# Altium footprint library rescap.PcbLib: 83 footprints (part 3 of 6)
Each footprint in its own frame and in the unit in brackets; x right, y up, seen from the top. Pads: shape width x height; smd on the part's side, far side on the other; paste and mask are expansions set on the pad; w line width, h text height; cw(c..) or ccw(c..) is an arc to the next point about the centre after c.
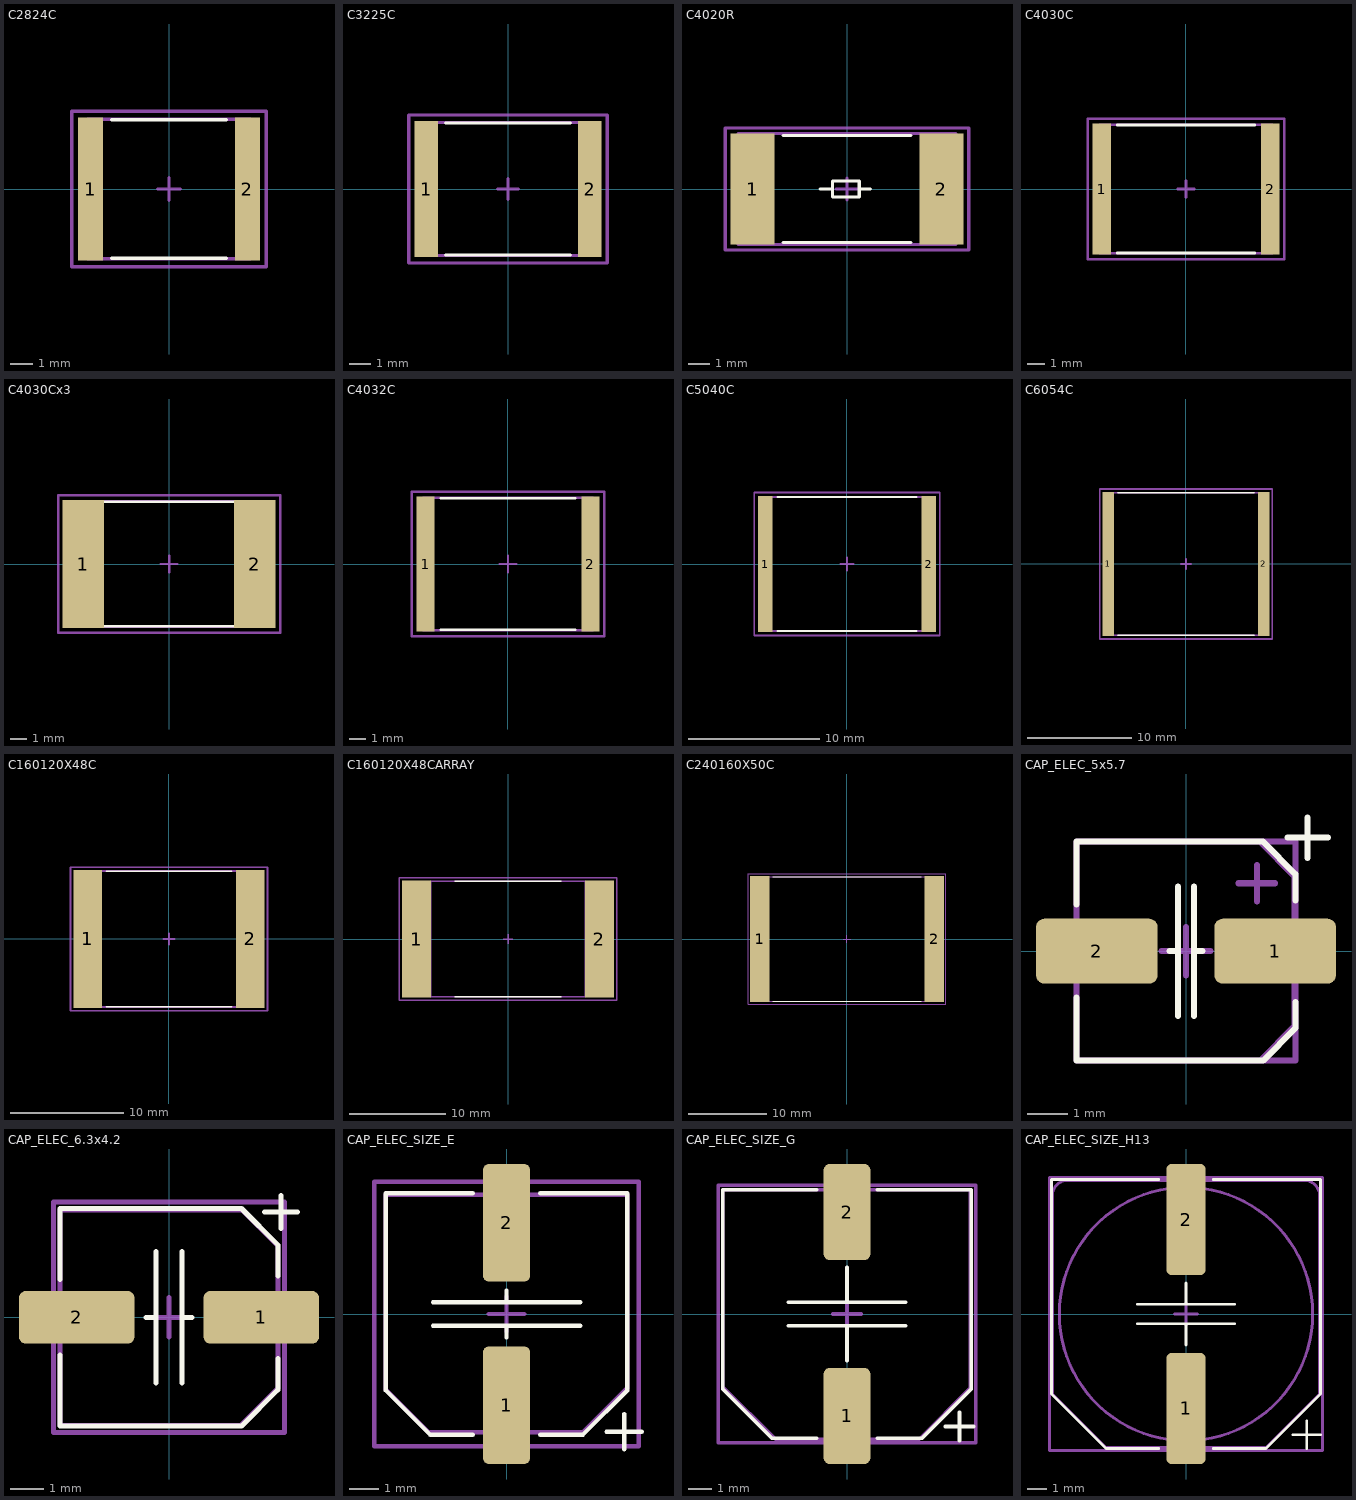
[diagram p2: the footprints below, top view; thin cyan lines are the x and y axes]

## C2824C [mm] "Chip Capacitor, 2-Leads, Body 7,10x6,10mm, IPC Medium Density"
height 3.9
pads (2):
  rect 1.1x6.25 smd: 1(-3.425,0) 2(3.425,0)
Top Overlay:
  lines w0.15: -2.5,-3.025 2.5,-3.025 ; -2.5,3.025 2.5,3.025
Mechanical 15:
  lines w0.15: -0.5,0 0.5,0 ; 0,-0.5 0,0.5 ; -4.25,-3.4 -4.25,3.4 4.25,3.4 4.25,-3.4 -4.25,-3.4
Mechanical 29:
  lines w0.15: -3.55,-3.05 -3.55,3.05 3.55,3.05 3.55,-3.05 -3.55,-3.05
  text ".Designator" at -3.1,-0.3 h1
3D body "C2824C.step": height 3.9, standoff 0, extent -3.55,-3.05 3.55,3.05

## C3225C [mm] "Chip Capacitor, 2-Leads, Body 8,00x6,30mm, IPC Medium Density"
height 3.2
pads (2):
  rect 1.1x6.45 smd: 1(-3.875,0) 2(3.875,0)
Top Overlay:
  lines w0.15: -2.95,-3.125 2.95,-3.125 ; -2.95,3.125 2.95,3.125
Mechanical 15:
  lines w0.15: -0.5,0 0.5,0 ; 0,-0.5 0,0.5 ; -4.7,-3.5 -4.7,3.5 4.7,3.5 4.7,-3.5 -4.7,-3.5
Mechanical 29:
  lines w0.15: -4,-3.15 -4,3.15 4,3.15 4,-3.15 -4,-3.15
  text ".Designator" at -3.6,-0.3 h1
3D body "C3225C.step": height 3.2, standoff 0, extent -4,-3.15 4,3.15

## C4020R [mm]
height 0.7
pads (2):
  rect 2.05x5.2 smd: 1(-4.425,0) 2(4.425,0)
Top Overlay:
  lines w0.15: -3,-2.5 3,-2.5 ; -3,2.5 3,2.5 ; -1.25,0 -0.675,0 ; 1.1,0 0.575,0 ; -0.675,0 -0.675,0.375 0.575,0.375 0.575,0 ; -0.675,0 -0.675,-0.375 0.575,-0.375 0.575,0
Mechanical 15:
  lines w0.15: -0.5,0 0.5,0 ; 0,-0.5 0,0.5 ; -5.7,-2.85 5.7,-2.85 5.7,2.85 -5.7,2.85 -5.7,-2.85
Mechanical 29:
  lines w0.15: -5.1,-2.6 5.1,-2.6 5.1,2.6 -5.1,2.6 -5.1,-2.6
  text ".Designator" at -3.8,-0.2 h1
3D body "C4020R.step": height 0.7, standoff 0, extent -5.1,-2.6 5.1,2.6

## C4030C [mm] "Chip Capacitor, 2-Leads, Body 10,20x7,60mm, IPC Medium Density"
height 3.9
pads (2):
  rect 1.1x7.75 smd: 1(-4.975,0) 2(4.975,0)
Top Overlay:
  lines w0.15: -4.05,-3.775 4.05,-3.775 ; -4.05,3.775 4.05,3.775
Mechanical 15:
  lines w0.15: -0.5,0 0.5,0 ; 0,-0.5 0,0.5 ; -5.8,-4.15 5.8,-4.15 5.8,4.15 -5.8,4.15 -5.8,-4.15
Mechanical 29:
  lines w0.15: -5.1,-3.8 5.1,-3.8 5.1,3.8 -5.1,3.8 -5.1,-3.8
  text ".Designator" at -3.4,-0.2 h1
3D body "SMD4030.STEP": height 3, standoff 0, extent -4.9,-4.2 5.1,4

## C4030Cx3 [mm] "Chip Capacitor, 2-Leads, Body 10,20x7,60mm, IPC Medium Density"
height 3.9
pads (2):
  rect 2.5x7.75 smd: 1(-5.2,0) 2(5.175,0)
Top Overlay:
  lines w0.15: -4.05,-3.775 4.05,-3.775 ; -4.05,3.775 4.05,3.775
Mechanical 15:
  lines w0.15: -0.5,0 0.5,0 ; 0,-0.5 0,0.5 ; -6.7,-4.15 6.7,-4.15 6.7,4.15 -6.7,4.15 -6.7,-4.15
Mechanical 29:
  lines w0.15: -5.1,-3.8 5.1,-3.8 5.1,3.8 -5.1,3.8 -5.1,-3.8
  text ".Designator" at -3.5,-0.3 h1
3D body: height 8, standoff 0, extent -0.501,-0.501 0.501,0.501
3D body "SMD4030.STEP": height 3, standoff 0, extent -4.9,-4.2 5.1,4
3D body "SMD4030.STEP": height 5.7, standoff 2.7, extent -4.9,-4.2 5.1,4
3D body "SMD4030.STEP": height 8.5, standoff 5.5, extent -4.9,-4.2 5.1,4

## C4032C [mm] "Chip Capacitor, 2-Leads, Body 10,20x8,00mm, IPC Medium Density"
height 3.2
pads (2):
  rect 1.1x8.15 smd: 1(-4.975,0) 2(4.975,0)
Top Overlay:
  lines w0.15: -4.05,-3.975 4.05,-3.975 ; -4.05,3.975 4.05,3.975
Mechanical 15:
  lines w0.15: -0.5,0 0.5,0 ; 0,-0.5 0,0.5 ; -5.8,-4.35 5.8,-4.35 5.8,4.35 -5.8,4.35 -5.8,-4.35
Mechanical 29:
  lines w0.15: -5.1,-4 5.1,-4 5.1,4 -5.1,4 -5.1,-4
  text ".Designator" at -3.8,-0.3 h1
3D body "C4032C.step": height 3.2, standoff 0, extent -5.1,-4 5.1,4

## C5040C [mm] "Chip Capacitor, 2-Leads, Body 12,70x10,20mm, IPC Medium Density"
height 4
pads (2):
  rect 1.1x10.35 smd: 1(-6.225,0) 2(6.225,0)
Top Overlay:
  lines w0.15: -5.3,-5.075 5.3,-5.075 ; -5.3,5.075 5.3,5.075
Mechanical 15:
  lines w0.15: -0.5,0 0.5,0 ; 0,-0.5 0,0.5 ; -7.05,-5.45 -7.05,5.45 7.05,5.45 7.05,-5.45 -7.05,-5.45
Mechanical 29:
  lines w0.15: -6.35,-5.1 -6.35,5.1 6.35,5.1 6.35,-5.1 -6.35,-5.1
  text ".Designator" at -3.8,-0.2 h1
3D body "C5040C.step": height 4, standoff 0, extent -6.35,-5.1 6.35,5.1

## C6054C [mm] "Chip Capacitor, 2-Leads, Body 15,20x13,70mm, IPC Medium Density"
height 4.8
pads (2):
  rect 1.1x13.85 smd: 1(-7.475,0) 2(7.475,0)
Top Overlay:
  lines w0.15: -6.55,-6.825 6.55,-6.825 ; -6.55,6.825 6.55,6.825
Mechanical 15:
  lines w0.15: -0.5,0 0.5,0 ; 0,-0.5 0,0.5 ; -8.3,-7.2 8.3,-7.2 8.3,7.2 -8.3,7.2 -8.3,-7.2
Mechanical 29:
  lines w0.15: -7.6,-6.85 7.6,-6.85 7.6,6.85 -7.6,6.85 -7.6,-6.85
  text ".Designator" at -3.7,-0.3 h1
3D body: height 4.8, standoff 0, extent 7,-6.85 7.6,6.85
3D body: height 4.8, standoff 0, extent -7.6,-6.85 -7,6.85
3D body: height 4.8, standoff 0, extent -7,-6.85 7,6.85

## C160120X48С [mm] "Chip Capacitor, 2-Leads, Body 16,00x12,00mm, IPC Medium Density"
height 4.8
pads (2):
  rect 2.5x12.15 smd: 1(-7.175,0) 2(7.175,0)
Top Overlay:
  lines w0.15: -5.55,-5.975 5.55,-5.975 ; -5.55,5.975 5.55,5.975
Mechanical 15:
  lines w0.15: -0.5,0 0.5,0 ; 0,-0.5 0,0.5 ; -8.7,-6.35 -8.7,6.35 8.7,6.35 8.7,-6.35 -8.7,-6.35
Mechanical 29:
  lines w0.15: -8,-6 -8,6 8,6 8,-6 -8,-6
  text ".Designator" at -3.2,-0.3 h1
3D body: height 4.8, standoff 0, extent -6,-6 6,6
3D body: height 4.8, standoff 0, extent -8,-6 -6,6
3D body: height 4.8, standoff 0, extent 6,-6 8,6

## C160120X48СARRAY [mm] "3x Chip Capacitor, 2-Leads, Body 16,00x12,00mm, IPC Medium Density"
height 16
pads (2):
  rect 3x12.15 smd: 1(-9.5,0) 2(9.5,0)
Top Overlay:
  lines w0.15: -5.55,-5.975 5.55,-5.975 ; -5.55,5.975 5.55,5.975
Mechanical 15:
  lines w0.15: -0.5,0 0.5,0 ; 0,-0.5 0,0.5 ; -11.3,-6.35 11.3,-6.35 11.3,6.35 -11.3,6.35 -11.3,-6.35
Mechanical 29:
  lines w0.15: -8,-6 8,-6 8,6 -8,6 -8,-6
  text ".Designator" at -3.7,-0.3 h1
3D body: height 19.8, standoff 15, extent 6,-6 8,6
3D body: height 19.8, standoff 15, extent -8,-6 -6,6
3D body: height 19.8, standoff 15, extent -6,-6 6,6
3D body: height 14.8, standoff 10, extent -6,-6 6,6
3D body: height 14.8, standoff 10, extent -8,-6 -6,6
3D body: height 14.8, standoff 10, extent 6,-6 8,6
3D body: height 9.8, standoff 5, extent -6,-6 6,6
3D body: height 9.8, standoff 5, extent -8,-6 -6,6
3D body: height 9.8, standoff 5, extent 6,-6 8,6
3D body: height 4.8, standoff 0, extent 6,-6 8,6
3D body: height 4.8, standoff 0, extent -8,-6 -6,6
3D body: height 4.8, standoff 0, extent -6,-6 6,6

## C240160X50C [mm] "Chip Capacitor, 2-Leads, Body 24,00x16,00mm, IPC Medium Density"
height 5
pads (2):
  rect 2.5x16.15 smd: 1(-11.175,0) 2(11.175,0)
Top Overlay:
  lines w0.15: -9.55,-7.975 9.55,-7.975 ; -9.55,7.975 9.55,7.975
Mechanical 15:
  lines w0.15: -0.5,0 0.5,0 ; 0,-0.5 0,0.5 ; -12.7,-8.35 12.7,-8.35 12.7,8.35 -12.7,8.35 -12.7,-8.35
Mechanical 29:
  lines w0.15: -12,-8 12,-8 12,8 -12,8 -12,-8
  text ".Designator" at -3.3,-0.3 h1
3D body: height 5, standoff 0, extent 10,-8 12,8
3D body: height 5, standoff 0, extent -12,-8 -10,8
3D body: height 5, standoff 0, extent -10,-8 10,8

## CAP_ELEC_5x5.7 [mm] "Capacitor, polarized, aluminum can; 5x5.7mm DxH"
height 5.7
pads (2):
  rrect25% 3x1.6 smd: 1(2.2,0) 2(-2.2,0)
Top Overlay:
  lines w0.15: -2.7,-1.15 -2.7,-2.7 1.9,-2.7 2.7,-1.9 2.7,-1.25 ; -2.7,1.15 -2.7,2.7 1.9,2.7 2.7,1.9 2.7,1.25 ; -0.4,0 -0.2,0 ; -0.2,-1.6 -0.2,1.6 ; 0.2,-1.6 0.2,1.6 ; 0.2,0 0.4,0 ; 2.5,2.8 3,2.8 3.5,2.8 ; 3,2.3 3,3.3
Mechanical 15:
  lines w0.15: -0.6,0 0,0 ; 0,-0.6 0,0 ; 0,0.6 0,0 ; 0.6,0 0,0 ; -2.7,-2.7 2.7,-2.7 2.7,2.7 -2.7,2.7 -2.7,-2.7
Mechanical 29:
  lines w0.15: 1.3,1.675 2.2,1.675 ; 1.75,1.225 1.75,2.125 ; -2.7,-2.7 -2.7,2.7 1.825,2.7 2.675,1.85 2.675,-1.85 1.825,-2.7 -2.7,-2.7
  text ".Designator" at -2.5,-0.4 h1
3D body "Cap, elec, 5x5.7_.STEP": height 5.7, standoff 0, extent -2.65,-2.65 2.65,2.65

## CAP_ELEC_6.3x4.2 [mm] "Capacitor, polarized, aluminum can; 6.3x4.2mm DxH"
height 4.2
pads (2):
  rrect25% 3.5x1.6 smd: 1(2.8,0) 2(-2.8,0)
Top Overlay:
  lines w0.15: -3.3,-1.15 -3.3,-3.3 2.2,-3.3 3.3,-2.2 3.3,-1.25 ; -3.3,1.15 -3.3,3.3 2.2,3.3 3.3,2.2 3.3,1.25 ; -0.7,0 -0.5,0 ; -0.4,-2 -0.4,2 ; 0.4,-2 0.4,2 ; 0.5,0 0.7,0 ; 2.9,3.2 3.4,3.2 3.9,3.2 ; 3.4,2.7 3.4,3.7
Mechanical 15:
  lines w0.15: -0.6,0 0,0 ; 0,-0.6 0,0 ; 0,0.6 0,0 ; 0.6,0 0,0 ; -3.5,-3.5 -3.5,3.5 3.5,3.5 3.5,-3.5 -3.5,-3.5
Mechanical 29:
  lines w0.15: -3.3,-3.275 2.175,-3.275 3.3,-2.15 3.3,2.175 2.225,3.25 -3.3,3.25 -3.3,-3.275
  text ".Designator" at -3,-0.3 h1
3D body "Cap, elec, 6.3x4.2.STEP": height 4.23, standoff 0, extent -3.3,-3.3 3.3,3.3

## CAP_ELEC_SIZE_E [mm] "Capacitor, polarized, aluminum can; 8.0x6.2mm DxH"
height 6.2
pads (2):
  rrect25% 1.6x4 smd: 1(0,-3.1) 2(0,3.1)
Top Overlay:
  lines w0.15: -2.5,-0.4 2.5,-0.4 ; -2.5,0.4 2.5,0.4 ; -1.15,-4.1 -2.6,-4.1 -4.1,-2.6 -4.1,4.1 -1.15,4.1 ; 0,-0.8 0,-0.4 ; 0,0.4 0,0.8 ; 1.15,-4.1 2.6,-4.1 4.1,-2.6 4.1,4.1 1.15,4.1 ; 3.4,-4 4.6,-4 ; 4,-4.6 4,-3.4
Mechanical 15:
  lines w0.15: -0.6,0 0,0 ; 0,-0.6 0,0 ; 0,0.6 0,0 ; 0.6,0 0,0 ; -4.5,-4.5 4.5,-4.5 4.5,4.5 -4.5,4.5 -4.5,-4.5
Mechanical 29:
  lines w0.15: -4.1,-2.575 -4.1,4.05 4.1,4.05 4.1,-2.525 2.6,-4.025 -2.65,-4.025 -4.1,-2.575
  text ".Designator" at -3.5,-0.3 h1
3D body "CAP Alum Elec Size E.STEP": height 6.5, standoff 0, extent -4.25,-4.75 4.25,4.75

## CAP_ELEC_SIZE_G [mm] "Capacitor, polarized, aluminum can; 10.0x10.2mm DxH"
height 10.2
pads (2):
  rrect25% 2x4.1 smd: 1(0,-4.35) 2(0,4.35)
Top Overlay:
  lines w0.15: -2.5,-0.5 2.5,-0.5 ; -2.5,0.5 2.5,0.5 ; -1.3,-5.3 -3.2,-5.3 -5.3,-3.2 -5.3,5.3 -1.3,5.3 ; 0,-2 0,-0.5 ; 0,0.5 0,2 ; 1.3,-5.3 3.2,-5.3 5.3,-3.2 5.3,5.3 1.3,5.3 ; 4.2,-4.8 5.4,-4.8 ; 4.8,-5.4 4.8,-4.2
Mechanical 15:
  lines w0.15: -0.6,0 0,0 ; 0,-0.6 0,0 ; 0,0.6 0,0 ; 0.6,0 0,0 ; -5.5,-5.5 -5.5,5.5 5.5,5.5 5.5,-5.5 -5.5,-5.5
Mechanical 29:
  lines w0.15: -5.3,-3.1 -5.3,5.3 5.25,5.3 5.25,-3.175 3.075,-5.35 -3.05,-5.35 -5.3,-3.1
  text ".Designator" at -3.4,-0.3 h1
3D body "CAP Alum Elec Size G.STEP": height 10.5, standoff 0, extent -5.25,-6 5.25,6

## CAP_ELEC_SIZE_H13 [mm] "Capacitor, polarized, aluminum can; 12.5x13.5mm DxH"
height 13.5
pads (2):
  rrect25% 2x5.7 smd: 1(0,-4.85) 2(0,4.85)
Top Overlay:
  lines w0.15: -2.5,-0.5 2.5,-0.5 ; -2.5,0.5 2.5,0.5 ; -1.4,-6.9 -4.1,-6.9 -6.9,-4.1 -6.9,6.9 -1.4,6.9 ; 0,-1.6 0,-0.5 ; 0,0.5 0,1.6 ; 1.4,-6.9 4.1,-6.9 6.9,-4.1 6.9,6.9 1.4,6.9 ; 5.5,-6.2 6.9,-6.2 ; 6.2,-6.9 6.2,-5.5
Mechanical 15:
  lines w0.15: -0.6,0 0,0 ; 0,-0.6 0,0 ; 0,0.6 0,0 ; 0.6,0 0,0 ; -7,-7 -7,7 7,7 7,-7 -7,-7
Mechanical 29:
  circle w0.15: c0,0 r6.5
  lines w0.15: -0.45,-6.85 -0.45,-7.5 0.45,-7.5 0.45,-6.85 ; -0.45,6.85 -0.45,7.5 0.45,7.5 0.45,6.85 ; -6.85,-4.11 -6.85,6.1 cw(c-6.1,6.1) -6.1,6.85 6.1,6.85 cw(c6.1,6.1) 6.85,6.1 6.85,-4.11 4.11,-6.85 -4.11,-6.85 -6.85,-4.11
  text ".Designator" at -3.8,-0.2 h1
3D body "CAP Alum Elec Size H13.STEP": height 14, standoff 0, extent -6.85,-7.5 6.85,7.5